# Altium integrated library BYTECH_HW_LIB_2019.IntLib: 907 symbols (part 2 of 6)
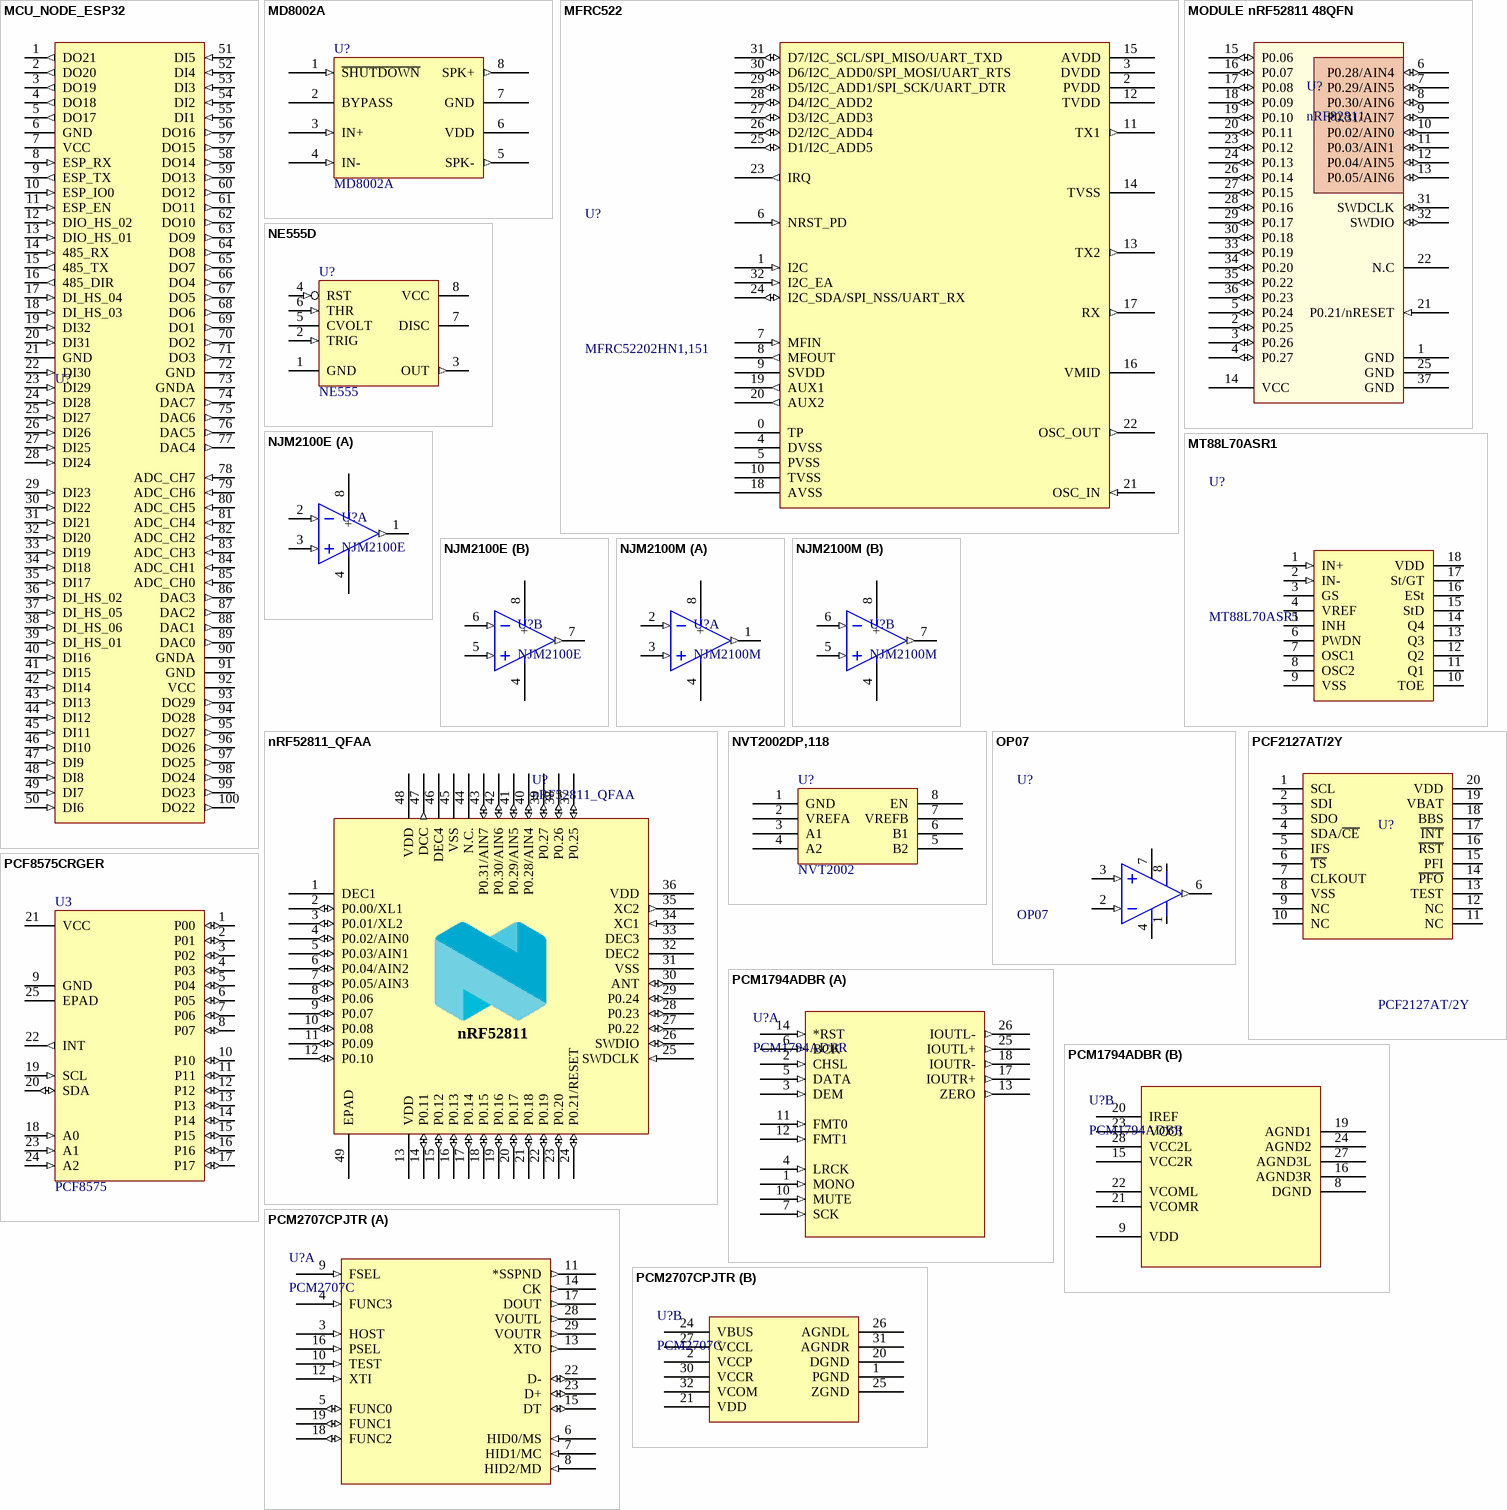
[diagram p40: symbols MCU_NODE_ESP32 to PCM2707CPJTR]

## PCM2707CPJTR
designator U?, comment PCM2707C
IC DAC 16BIT STER W/USB 32TQFP; MFR: Texas Instruments; MPN: PCM2707CPJTR; Solder: SMT; Category: IC; Value: PCM2707C
footprint PJT32
part A pins: 3 HOST (in), 4 FUNC3 (in), 5 FUNC0 (io), 6 HID0/MS (in), 7 HID1/MC (in), 8 HID2/MD (in), 9 FSEL (in), 10 TEST (in), 11 *SSPND (out), 12 XTI (in), 13 XTO (out), 14 CK (out), 15 DT (io), 16 PSEL (in), 17 DOUT (out), 18 FUNC2 (io), 19 FUNC1 (io), 22 D- (io), 23 D+ (io), 28 VOUTL (out), 29 VOUTR (out)
part B pins: 1 PGND (power), 2 VCCP (power), 20 DGND (power), 21 VDD (power), 24 VBUS (power), 25 ZGND (power), 26 AGNDL (power), 27 VCCL (power), 30 VCCR (power), 31 AGNDR (power), 32 VCOM (power)

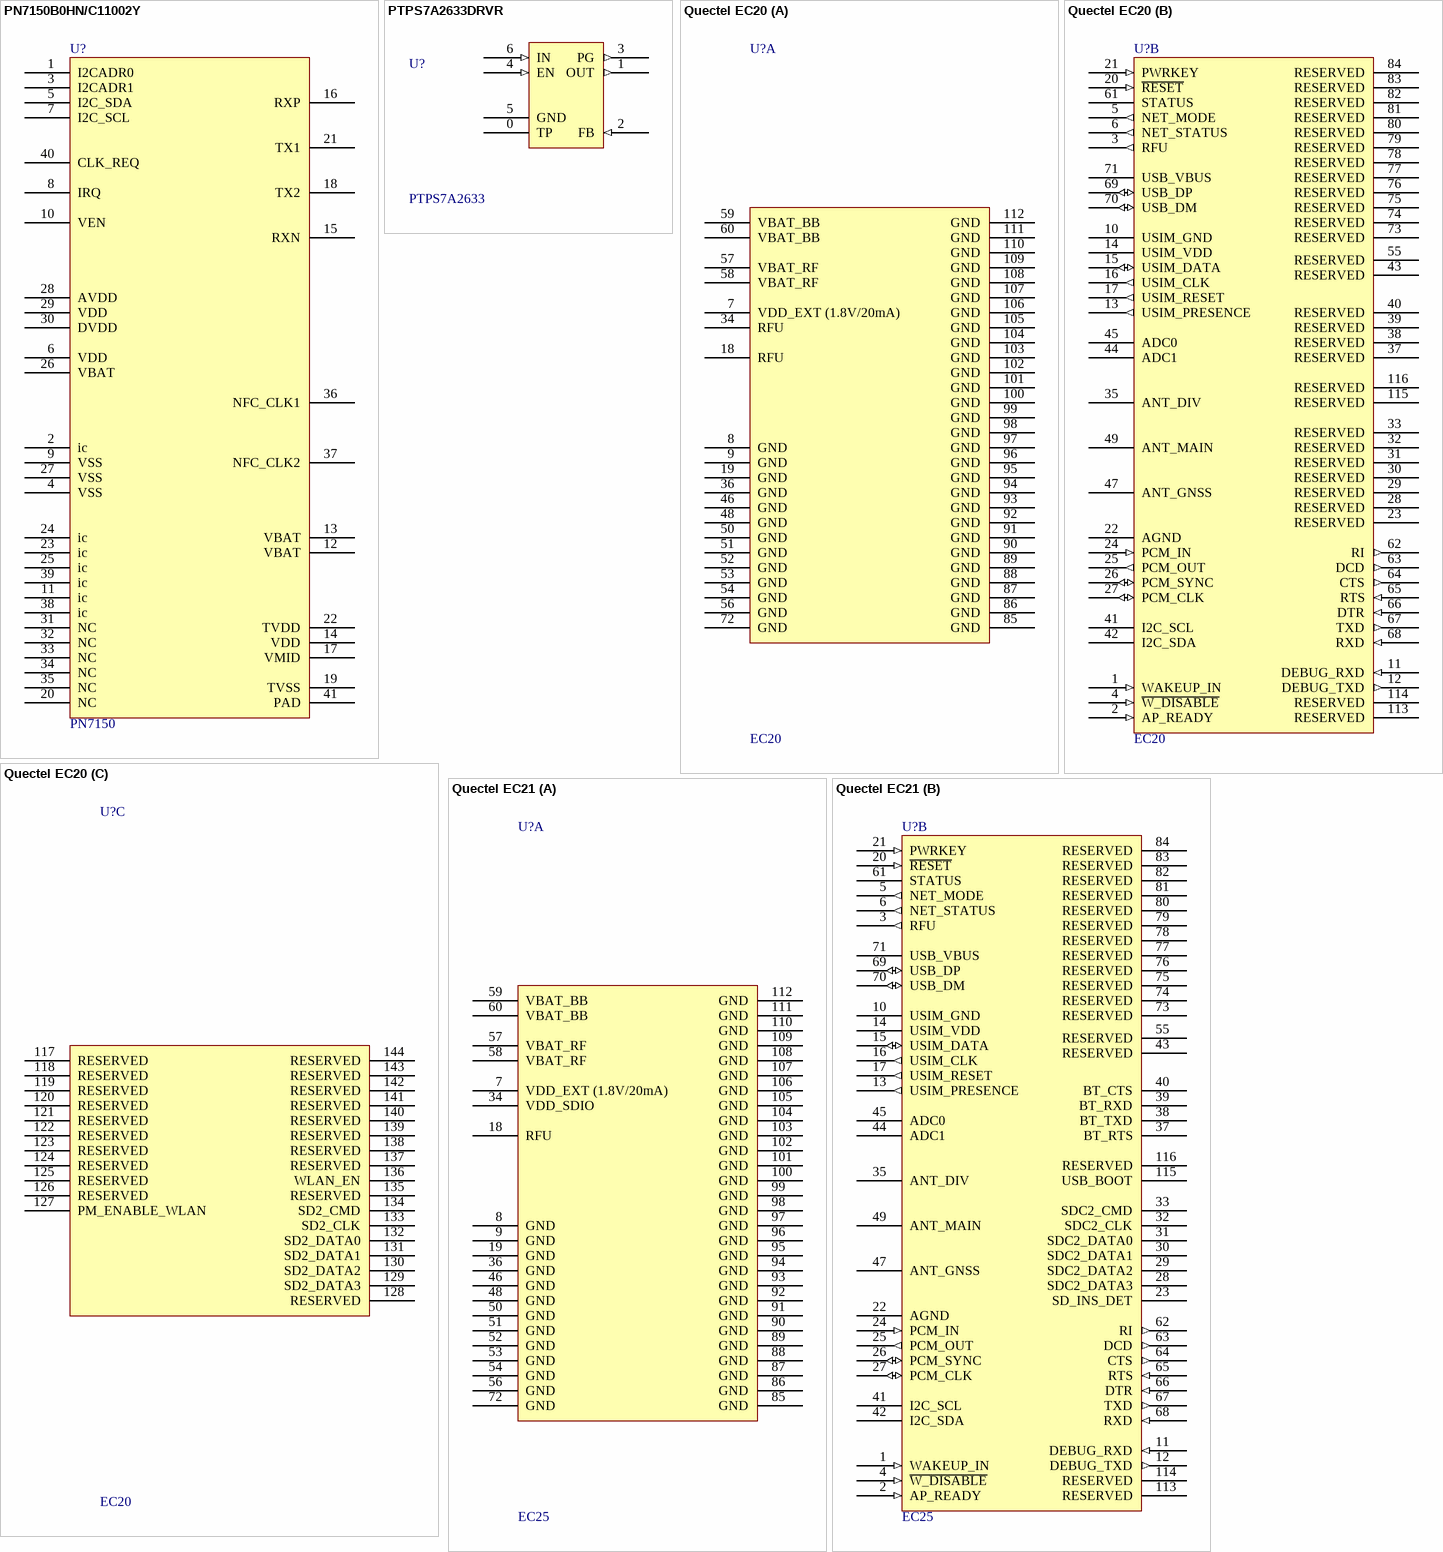
[diagram p7: symbols PN7150B0HN/C11002Y to Quectel EC21]

## PN7150B0HN/C11002Y
designator U?, comment PN7150
RFID Reader IC 13.56MHz FeliCa, ISO 14443, MIFARE, NFC I²C, UART 2.3 V ~ 5.5 V 40-VFQFN Exposed Pad; MPN: PN7150B0HN/C11002Y; Solder: SMT; Value: PN7150; Category: IC
footprint VQFN-40
pins: 1 I2CADR0, 2 ic, 3 I2CADR1, 4 VSS, 5 I2C_SDA, 6 VDD, 7 I2C_SCL, 8 IRQ, 9 VSS, 10 VEN, 11 ic, 12 VBAT, 13 VBAT, 14 VDD, 15 RXN, 16 RXP, 17 VMID, 18 TX2, 19 TVSS, 20 NC, 21 TX1, 22 TVDD, 23 ic, 24 ic, 25 ic, 26 VBAT, 27 VSS, 28 AVDD, 29 VDD, 30 DVDD, 31 NC, 32 NC, 33 NC, 34 NC, 35 NC, 36 NFC_CLK1, 37 NFC_CLK2, 38 ic, 39 ic, 40 CLK_REQ, 41 PAD

## PTPS7A2633DRVR
designator U?, comment PTPS7A2633
TPS7A26 500-mA, 18-V, ultra-low IQ, LDO 3.3V; MPN: PTPS7A2633DRVR; MFR: Texas Instruments; Solder: SMT; Value: PTPS7A2633; Category: IC; PinCount: 7
footprint WSON6-2x2 (Footprint not found)
pins: 0 TP, 1 OUT (out), 2 FB (in), 3 PG (out), 4 EN (in), 5 GND (power), 6 IN (in)

## Quectel EC20
designator U?, comment EC20
Value: EC20A; Solder: SMT; MPN: EC20A; Category: MODULE
footprint QUECTEL_EC25
part A pins: 7 VDD_EXT (1.8V/20mA) (power), 8 GND (power), 9 GND (power), 18 RFU (power), 19 GND (power), 34 RFU (power), 36 GND (power), 46 GND (power), 48 GND (power), 50 GND (power), 51 GND (power), 52 GND (power), 53 GND (power), 54 GND (power), 56 GND (power), 57 VBAT_RF (power), 58 VBAT_RF (power), 59 VBAT_BB (power), 60 VBAT_BB (power), 72 GND (power), 85 GND (power), 86 GND (power), 87 GND (power), 88 GND (power), 89 GND (power), 90 GND (power), 91 GND (power), 92 GND (power), 93 GND (power), 94 GND (power), 95 GND (power), 96 GND (power), 97 GND (power), 98 GND (power), 99 GND (power), 100 GND (power), 101 GND (power), 102 GND (power), 103 GND (power), 104 GND (power), 105 GND (power), 106 GND (power), 107 GND (power), 108 GND (power), 109 GND (power), 110 GND (power), 111 GND (power), 112 GND (power)
part B pins: 1 WAKEUP_IN (in), 2 AP_READY (in), 3 RFU (out), 4 ~{W_DISABLE} (in), 5 NET_MODE (out), 6 NET_STATUS (out), 10 USIM_GND (power), 11 DEBUG_RXD (in), 12 DEBUG_TXD (out), 13 USIM_PRESENCE (out), 14 USIM_VDD (power), 15 USIM_DATA (io), 16 USIM_CLK (out), 17 USIM_RESET (out), 20 ~{RESET} (in), 21 PWRKEY (in), 22 AGND (power), 23 RESERVED, 24 PCM_IN (in), 25 PCM_OUT (out), 26 PCM_SYNC (io), 27 PCM_CLK (io), 28 RESERVED, 29 RESERVED, 30 RESERVED, 31 RESERVED, 32 RESERVED, 33 RESERVED, 35 ANT_DIV, 37 RESERVED, 38 RESERVED, 39 RESERVED, 40 RESERVED, 41 I2C_SCL (oe), 42 I2C_SDA (oe), 43 RESERVED, 44 ADC1 (hiz) "0.2V-4.2V", 45 ADC0 (hiz) "0.2V-2.1V", 47 ANT_GNSS, 49 ANT_MAIN, 55 RESERVED, 61 STATUS (oe), 62 RI (out), 63 DCD (out), 64 CTS (out), 65 RTS (in), 66 DTR (in), 67 TXD (out), 68 RXD (in), 69 USB_DP (io), 70 USB_DM (io), 71 USB_VBUS (power), 73 RESERVED, 74 RESERVED, 75 RESERVED, 76 RESERVED, 77 RESERVED, 78 RESERVED, 79 RESERVED, 80 RESERVED, 81 RESERVED, 82 RESERVED, 83 RESERVED, 84 RESERVED, 113 RESERVED, 114 RESERVED, 115 RESERVED, 116 RESERVED
part C pins: 117 RESERVED, 118 RESERVED, 119 RESERVED, 120 RESERVED, 121 RESERVED, 122 RESERVED, 123 RESERVED, 124 RESERVED, 125 RESERVED, 126 RESERVED, 127 PM_ENABLE_WLAN, 128 RESERVED, 129 SD2_DATA3, 130 SD2_DATA2, 131 SD2_DATA1, 132 SD2_DATA0, 133 SD2_CLK, 134 SD2_CMD, 135 RESERVED, 136 WLAN_EN, 137 RESERVED, 138 RESERVED, 139 RESERVED, 140 RESERVED, 141 RESERVED, 142 RESERVED, 143 RESERVED, 144 RESERVED

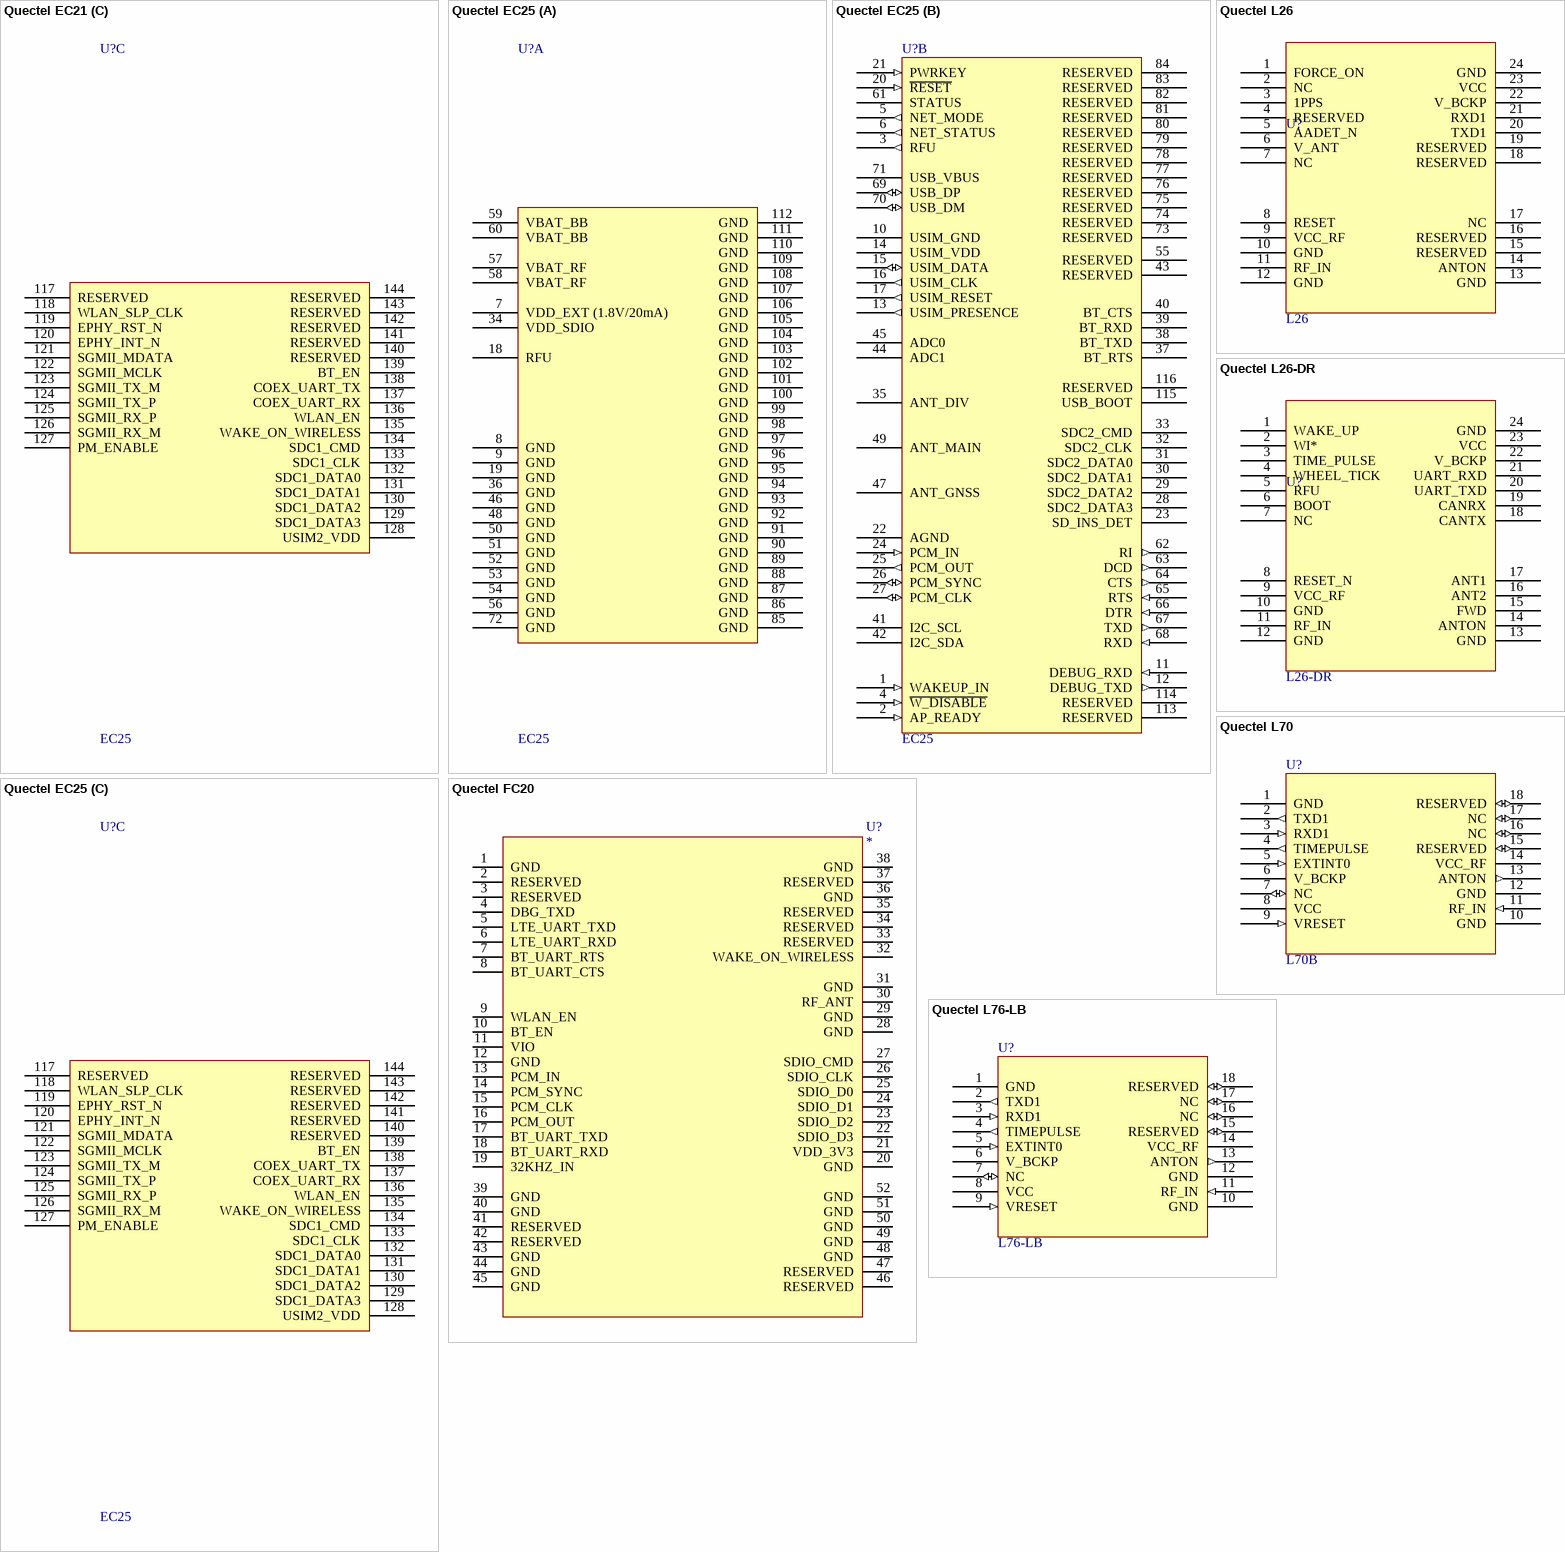
[diagram p8: symbols Quectel EC21 to Quectel L76-LB]

## Quectel EC21
designator U?, comment EC25
MFR: Quectel; Value: EC21; Solder: SMT; MPN: EC21; Category: MODULE
footprint QUECTEL_EC21
part A pins: 7 VDD_EXT (1.8V/20mA) (power), 8 GND (power), 9 GND (power), 18 RFU (power), 19 GND (power), 34 VDD_SDIO (power), 36 GND (power), 46 GND (power), 48 GND (power), 50 GND (power), 51 GND (power), 52 GND (power), 53 GND (power), 54 GND (power), 56 GND (power), 57 VBAT_RF (power), 58 VBAT_RF (power), 59 VBAT_BB (power), 60 VBAT_BB (power), 72 GND (power), 85 GND (power), 86 GND (power), 87 GND (power), 88 GND (power), 89 GND (power), 90 GND (power), 91 GND (power), 92 GND (power), 93 GND (power), 94 GND (power), 95 GND (power), 96 GND (power), 97 GND (power), 98 GND (power), 99 GND (power), 100 GND (power), 101 GND (power), 102 GND (power), 103 GND (power), 104 GND (power), 105 GND (power), 106 GND (power), 107 GND (power), 108 GND (power), 109 GND (power), 110 GND (power), 111 GND (power), 112 GND (power)
part B pins: 1 WAKEUP_IN (in), 2 AP_READY (in), 3 RFU (out), 4 ~{W_DISABLE} (in), 5 NET_MODE (out), 6 NET_STATUS (out), 10 USIM_GND (power), 11 DEBUG_RXD (in), 12 DEBUG_TXD (out), 13 USIM_PRESENCE (out), 14 USIM_VDD (power), 15 USIM_DATA (io), 16 USIM_CLK (out), 17 USIM_RESET (out), 20 ~{RESET} (in), 21 PWRKEY (in), 22 AGND (power), 23 SD_INS_DET, 24 PCM_IN (in), 25 PCM_OUT (out), 26 PCM_SYNC (io), 27 PCM_CLK (io), 28 SDC2_DATA3, 29 SDC2_DATA2, 30 SDC2_DATA1, 31 SDC2_DATA0, 32 SDC2_CLK, 33 SDC2_CMD, 35 ANT_DIV, 37 BT_RTS, 38 BT_TXD, 39 BT_RXD, 40 BT_CTS, 41 I2C_SCL (oe), 42 I2C_SDA (oe), 43 RESERVED, 44 ADC1 (hiz) "0.2V-4.2V", 45 ADC0 (hiz) "0.2V-2.1V", 47 ANT_GNSS, 49 ANT_MAIN, 55 RESERVED, 61 STATUS (oe), 62 RI (out), 63 DCD (out), 64 CTS (out), 65 RTS (in), 66 DTR (in), 67 TXD (out), 68 RXD (in), 69 USB_DP (io), 70 USB_DM (io), 71 USB_VBUS (power), 73 RESERVED, 74 RESERVED, 75 RESERVED, 76 RESERVED, 77 RESERVED, 78 RESERVED, 79 RESERVED, 80 RESERVED, 81 RESERVED, 82 RESERVED, 83 RESERVED, 84 RESERVED, 113 RESERVED, 114 RESERVED, 115 USB_BOOT, 116 RESERVED
part C pins: 117 RESERVED, 118 WLAN_SLP_CLK, 119 EPHY_RST_N, 120 EPHY_INT_N, 121 SGMII_MDATA, 122 SGMII_MCLK, 123 SGMII_TX_M, 124 SGMII_TX_P, 125 SGMII_RX_P, 126 SGMII_RX_M, 127 PM_ENABLE, 128 USIM2_VDD, 129 SDC1_DATA3, 130 SDC1_DATA2, 131 SDC1_DATA1, 132 SDC1_DATA0, 133 SDC1_CLK, 134 SDC1_CMD, 135 WAKE_ON_WIRELESS, 136 WLAN_EN, 137 COEX_UART_RX, 138 COEX_UART_TX, 139 BT_EN, 140 RESERVED, 141 RESERVED, 142 RESERVED, 143 RESERVED, 144 RESERVED

## Quectel EC25
designator U?, comment EC25
MFR: Quectel; Value: EC25A; Solder: SMT; MPN: EC25A; Category: MODULE
footprint QUECTEL_EC25
part A pins: 7 VDD_EXT (1.8V/20mA) (power), 8 GND (power), 9 GND (power), 18 RFU (power), 19 GND (power), 34 VDD_SDIO (power), 36 GND (power), 46 GND (power), 48 GND (power), 50 GND (power), 51 GND (power), 52 GND (power), 53 GND (power), 54 GND (power), 56 GND (power), 57 VBAT_RF (power), 58 VBAT_RF (power), 59 VBAT_BB (power), 60 VBAT_BB (power), 72 GND (power), 85 GND (power), 86 GND (power), 87 GND (power), 88 GND (power), 89 GND (power), 90 GND (power), 91 GND (power), 92 GND (power), 93 GND (power), 94 GND (power), 95 GND (power), 96 GND (power), 97 GND (power), 98 GND (power), 99 GND (power), 100 GND (power), 101 GND (power), 102 GND (power), 103 GND (power), 104 GND (power), 105 GND (power), 106 GND (power), 107 GND (power), 108 GND (power), 109 GND (power), 110 GND (power), 111 GND (power), 112 GND (power)
part B pins: 1 WAKEUP_IN (in), 2 AP_READY (in), 3 RFU (out), 4 ~{W_DISABLE} (in), 5 NET_MODE (out), 6 NET_STATUS (out), 10 USIM_GND (power), 11 DEBUG_RXD (in), 12 DEBUG_TXD (out), 13 USIM_PRESENCE (out), 14 USIM_VDD (power), 15 USIM_DATA (io), 16 USIM_CLK (out), 17 USIM_RESET (out), 20 ~{RESET} (in), 21 PWRKEY (in), 22 AGND (power), 23 SD_INS_DET, 24 PCM_IN (in), 25 PCM_OUT (out), 26 PCM_SYNC (io), 27 PCM_CLK (io), 28 SDC2_DATA3, 29 SDC2_DATA2, 30 SDC2_DATA1, 31 SDC2_DATA0, 32 SDC2_CLK, 33 SDC2_CMD, 35 ANT_DIV, 37 BT_RTS, 38 BT_TXD, 39 BT_RXD, 40 BT_CTS, 41 I2C_SCL (oe), 42 I2C_SDA (oe), 43 RESERVED, 44 ADC1 (hiz) "0.2V-4.2V", 45 ADC0 (hiz) "0.2V-2.1V", 47 ANT_GNSS, 49 ANT_MAIN, 55 RESERVED, 61 STATUS (oe), 62 RI (out), 63 DCD (out), 64 CTS (out), 65 RTS (in), 66 DTR (in), 67 TXD (out), 68 RXD (in), 69 USB_DP (io), 70 USB_DM (io), 71 USB_VBUS (power), 73 RESERVED, 74 RESERVED, 75 RESERVED, 76 RESERVED, 77 RESERVED, 78 RESERVED, 79 RESERVED, 80 RESERVED, 81 RESERVED, 82 RESERVED, 83 RESERVED, 84 RESERVED, 113 RESERVED, 114 RESERVED, 115 USB_BOOT, 116 RESERVED
part C pins: 117 RESERVED, 118 WLAN_SLP_CLK, 119 EPHY_RST_N, 120 EPHY_INT_N, 121 SGMII_MDATA, 122 SGMII_MCLK, 123 SGMII_TX_M, 124 SGMII_TX_P, 125 SGMII_RX_P, 126 SGMII_RX_M, 127 PM_ENABLE, 128 USIM2_VDD, 129 SDC1_DATA3, 130 SDC1_DATA2, 131 SDC1_DATA1, 132 SDC1_DATA0, 133 SDC1_CLK, 134 SDC1_CMD, 135 WAKE_ON_WIRELESS, 136 WLAN_EN, 137 COEX_UART_RX, 138 COEX_UART_TX, 139 BT_EN, 140 RESERVED, 141 RESERVED, 142 RESERVED, 143 RESERVED, 144 RESERVED

## Quectel FC20
designator U?
MFR: Quectel; MPN: EFC20; Solder: SMT; Value: FC20; Part Description: *; PCB DECAL: *; Category: MODULE
footprint QUECTEL FC20 (Footprint not found)
pins: 1 GND, 2 RESERVED, 3 RESERVED, 4 DBG_TXD, 5 LTE_UART_TXD, 6 LTE_UART_RXD, 7 BT_UART_RTS, 8 BT_UART_CTS, 9 WLAN_EN, 10 BT_EN, 11 VIO, 12 GND, 13 PCM_IN, 14 PCM_SYNC, 15 PCM_CLK, 16 PCM_OUT, 17 BT_UART_TXD, 18 BT_UART_RXD, 19 32KHZ_IN, 20 GND, 21 VDD_3V3, 22 SDIO_D3, 23 SDIO_D2, 24 SDIO_D1, 25 SDIO_D0, 26 SDIO_CLK, 27 SDIO_CMD, 28 GND, 29 GND, 30 RF_ANT, 31 GND, 32 WAKE_ON_WIRELESS, 33 RESERVED, 34 RESERVED, 35 RESERVED, 36 GND, 37 RESERVED, 38 GND, 39 GND, 40 GND, 41 RESERVED, 42 RESERVED, 43 GND, 44 GND, 45 GND, 46 RESERVED, 47 RESERVED, 48 GND, 49 GND, 50 GND, 51 GND, 52 GND
2 alternate drawings of the same symbol

## Quectel L26
designator U?, comment L26
GNSS Module Quectel L26; Solder: SMT; Value: L26; MPN: L26; MFR: Quectel; Category: MODULE; PinCount: 24
footprint QUECTEL_L26 (Footprint not found)
pins: 1 FORCE_ON, 2 NC, 3 1PPS, 4 RESERVED, 5 AADET_N, 6 V_ANT, 7 NC, 8 RESET, 9 VCC_RF, 10 GND, 11 RF_IN, 12 GND, 13 GND, 14 ANTON, 15 RESERVED, 16 RESERVED, 17 NC, 18 RESERVED, 19 RESERVED, 20 TXD1, 21 RXD1, 22 V_BCKP, 23 VCC, 24 GND

## Quectel L26-DR
designator U?, comment L26-DR
GNSS Module Quectel L26-DR; Solder: SMT; Value: L26-DR; MPN: L26-DR; MFR: Quectel; Category: MODULE; PinCount: 24
footprint QUECTEL_L26 (Footprint not found)
pins: 1 WAKE_UP, 2 WI*, 3 TIME_PULSE, 4 WHEEL_TICK, 5 RFU, 6 BOOT, 7 NC, 8 RESET_N, 9 VCC_RF, 10 GND, 11 RF_IN, 12 GND, 13 GND, 14 ANTON, 15 FWD, 16 ANT2, 17 ANT1, 18 CANTX, 19 CANRX, 20 UART_TXD, 21 UART_RXD, 22 V_BCKP, 23 VCC, 24 GND

## Quectel L70
designator U?, comment L70B
GPS Module L70B, Quectel; Solder: SMT; Value: L70B; MPN: L70B; Category: MODULE
footprint GPS.L70
pins: 1 GND (power), 2 TXD1 (out), 3 RXD1 (in), 4 TIMEPULSE (out), 5 EXTINT0 (in), 6 V_BCKP (power), 7 NC (io), 8 VCC (power), 9 VRESET (in), 10 GND (power), 11 RF_IN (in), 12 GND (power), 13 ANTON (out), 14 VCC_RF (power), 15 RESERVED (io), 16 NC (io), 17 NC (io), 18 RESERVED (io)

## Quectel L76-LB
designator U?, comment L76-LB
GPS Module L76-LB, Quectel; Solder: SMT; Value: L76-LB; MPN: L76-LB; MFR: Quectel; Category: MODULE; PinCount: 18
footprint GPS.L7x (Footprint not found)
pins: 1 GND (power), 2 TXD1 (out), 3 RXD1 (in), 4 TIMEPULSE (out), 5 EXTINT0 (in), 6 V_BCKP (power), 7 NC (io), 8 VCC (power), 9 VRESET (in), 10 GND (power), 11 RF_IN (in), 12 GND (power), 13 ANTON (out), 14 VCC_RF (power), 15 RESERVED (io), 16 NC (io), 17 NC (io), 18 RESERVED (io)

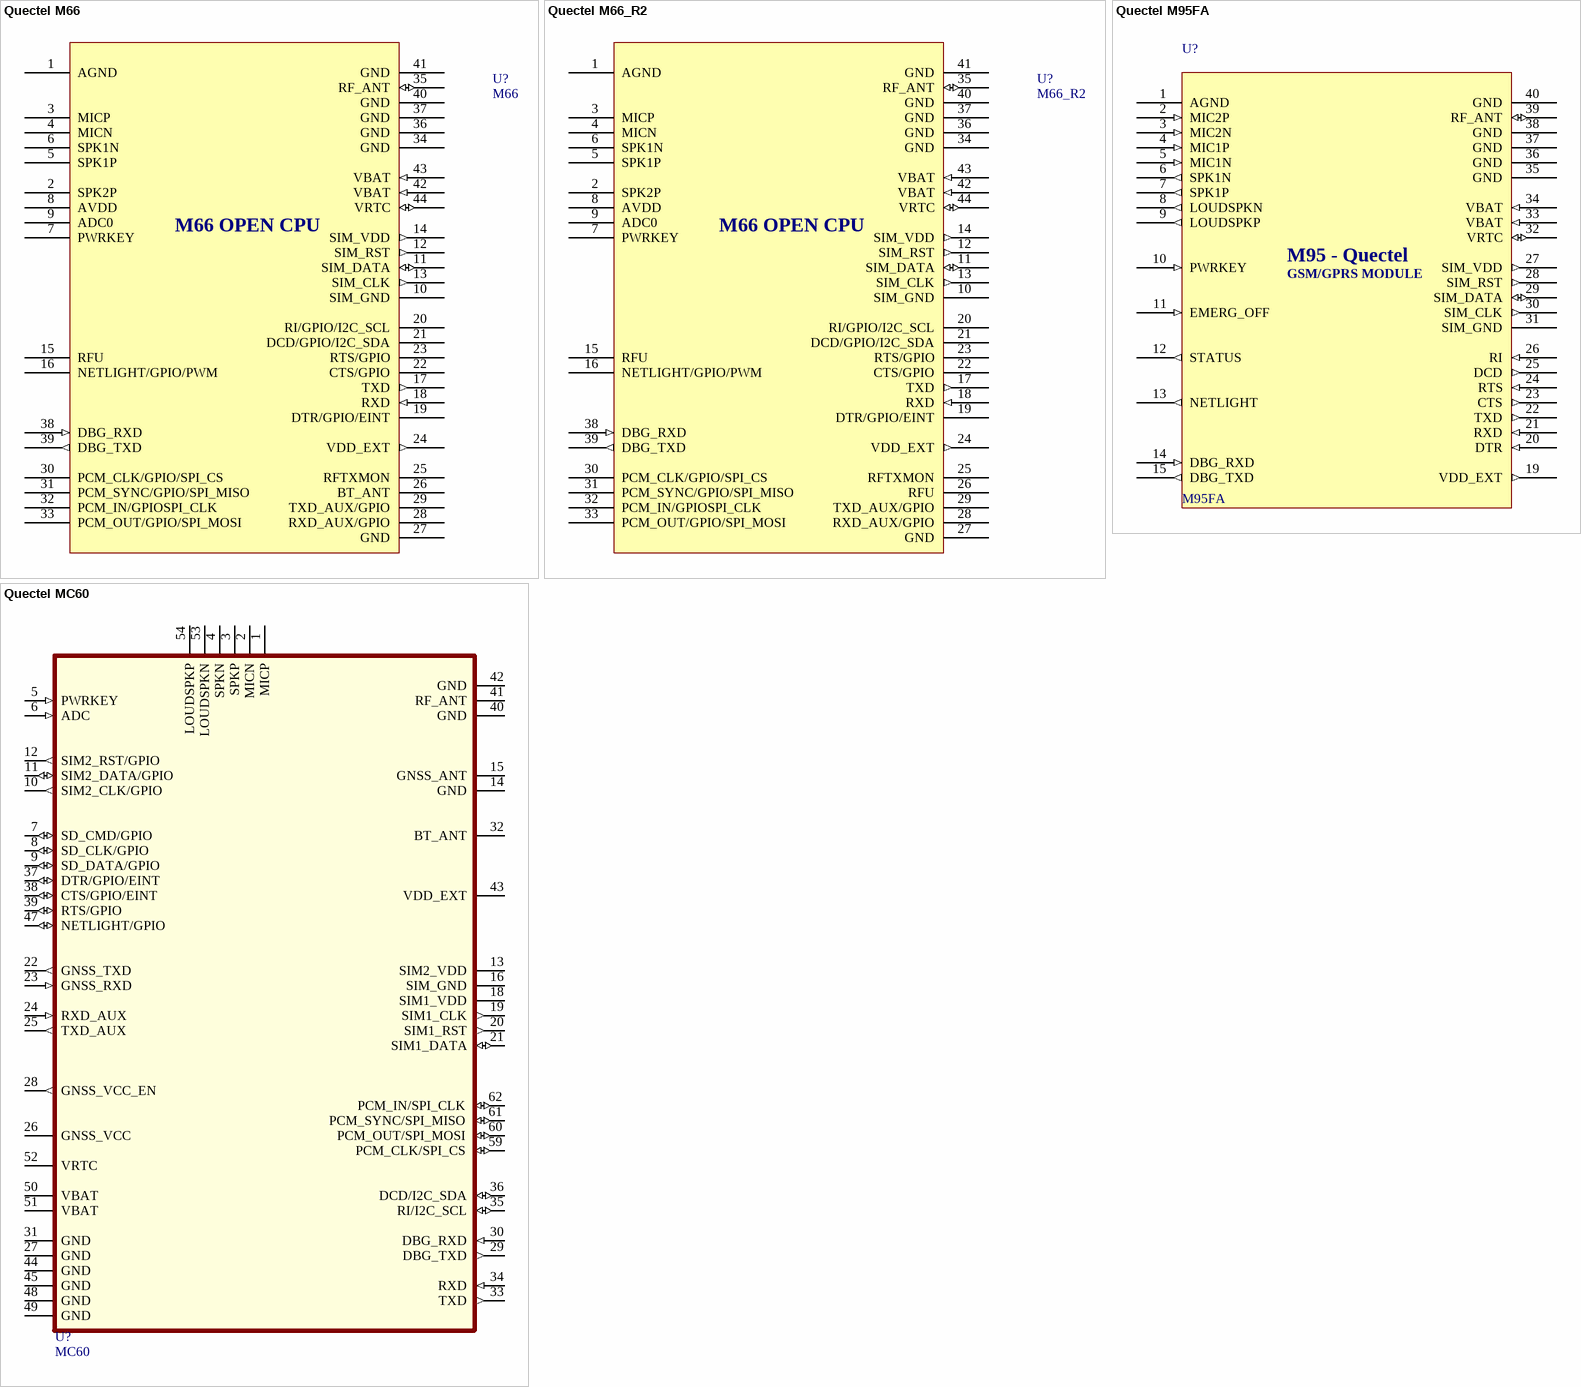
[diagram p9: symbols Quectel M66 to Quectel MC60]

## Quectel M66
designator U?, comment M66
GSM MODULE OPEN CPU; MFR: Quectel; Solder: SMT; MPN: M66; Value: M66; Category: MODULE
footprint M66
pins: 1 AGND (power), 2 SPK2P, 3 MICP, 4 MICN, 5 SPK1P, 6 SPK1N, 7 PWRKEY, 8 AVDD, 9 ADC0, 10 SIM_GND (power), 11 SIM_DATA (io), 12 SIM_RST (out), 13 SIM_CLK (out), 14 SIM_VDD (out), 15 RFU, 16 NETLIGHT/GPIO/PWM, 17 TXD (out), 18 RXD (in), 19 DTR/GPIO/EINT, 20 RI/GPIO/I2C_SCL, 21 DCD/GPIO/I2C_SDA, 22 CTS/GPIO, 23 RTS/GPIO, 24 VDD_EXT (out), 25 RFTXMON, 26 BT_ANT, 27 GND, 28 RXD_AUX/GPIO, 29 TXD_AUX/GPIO, 30 PCM_CLK/GPIO/SPI_CS, 31 PCM_SYNC/GPIO/SPI_MISO, 32 PCM_IN/GPIOSPI_CLK, 33 PCM_OUT/GPIO/SPI_MOSI, 34 GND, 35 RF_ANT (io), 36 GND (power), 37 GND (power), 38 DBG_RXD (in), 39 DBG_TXD (out), 40 GND (power), 41 GND (power), 42 VBAT (in), 43 VBAT (in), 44 VRTC (io)